# Altium footprint library cool_library.PcbLib: 1182 footprints (part 57 of 75)
Each footprint in its own frame and in the unit in brackets; x right, y up, seen from the top. Pads: shape width x height; smd on the part's side, far side on the other; paste and mask are expansions set on the pad; w line width, h text height; cw(c..) or ccw(c..) is an arc to the next point about the centre after c.
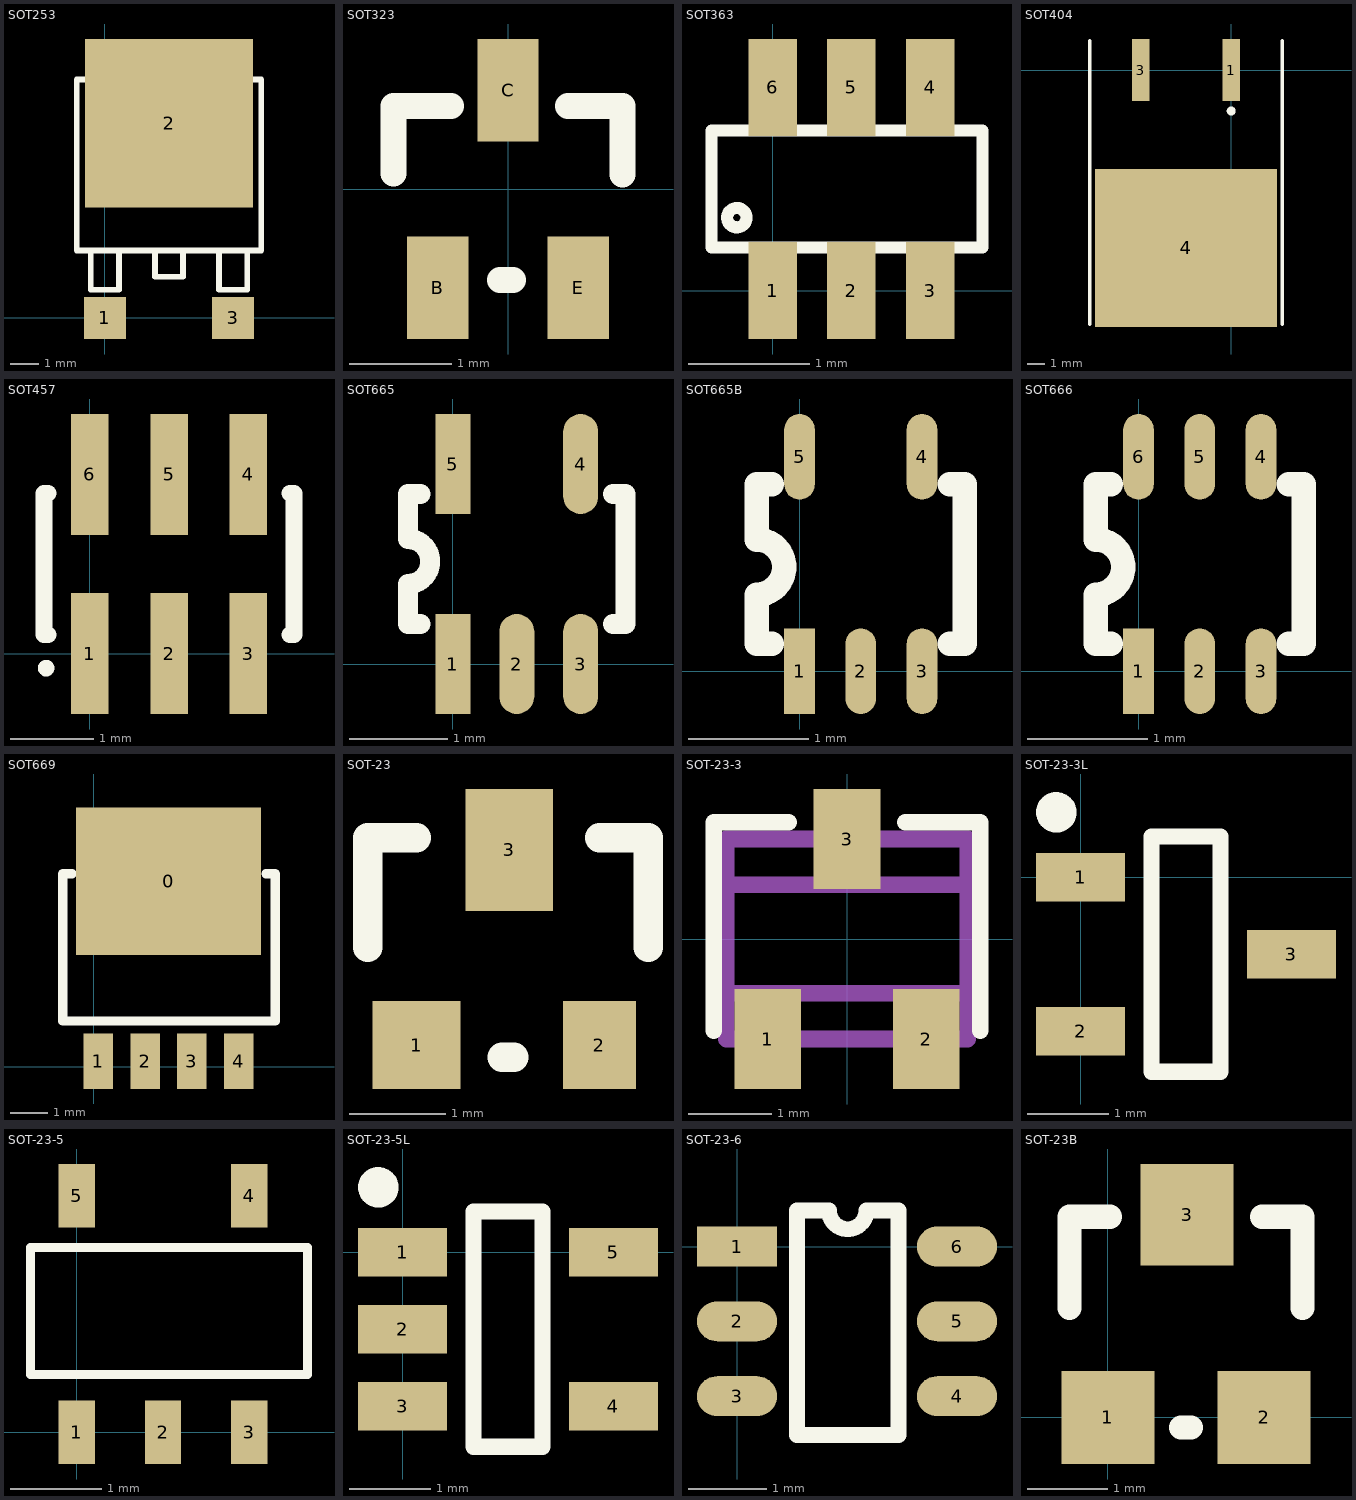
[diagram p56: the footprints below, top view; thin cyan lines are the x and y axes]

## SOT253 [mm]
pads (3):
  rect 1.5x1.5 smd: 1(0,0) 3(4.57,0)
  rect 6x6 smd: 2(2.285,6.94)
Top Overlay:
  lines w0.203: -0.755,8.5 -1.005,8.5 -1.005,2.4 5.575,2.4 5.575,8.5 5.325,8.5 ; -0.5,2.4 -0.5,1 0.5,1 0.5,2.4 ; 1.785,2.4 1.785,1.47 2.785,1.47 2.785,2.4 ; 4.07,2.4 4.07,1 5.07,1 5.07,2.4

## SOT323 [mm]
pads (3):
  rect 0.6x1 smd: B(-0.686,-0.965) C(0,0.965) E(0.686,-0.965)
Top Overlay:
  lines w0.254: -1.118,0.152 -1.118,0.813 -0.559,0.813 ; -0.076,-0.889 0.051,-0.889 ; 0.584,0.813 1.118,0.813 1.118,0.143
3D body: height 1.1, standoff 0, extent -1.092,-1.097 1.108,1.148

## SOT363 [mm]
pads (6):
  rect 0.4x0.8 smd: 1(0,0) 2(0.65,0) 3(1.3,0) 4(1.3,1.676) 5(0.65,1.676) 6(0,1.676)
Top Overlay:
  circle w0.1: c-0.295,0.602 r0.08
  lines w0.1: -0.503,0.356 1.732,0.356 1.732,1.321 -0.503,1.321 -0.503,0.356

## SOT404 [mm]
pads (3):
  rect 1x3.5 smd: 1(0,0) 3(-5.08,0)
  rect 10.25x8.9 smd: 4(-2.54,-9.998)
Top Overlay:
  circle w0.25: c0,-2.3 r0.125
  lines w0.2: -7.965,-14.3 -7.965,1.65 ; 2.885,-14.3 2.885,1.65

## SOT457 [mm]
pads (6):
  rect 0.45x1.45 smd: 1(0,0) 2(0.95,0) 3(1.9,0) 4(1.9,2.15) 5(0.95,2.15) 6(0,2.15)
Top Overlay:
  circle w0.1: c-0.525,-0.175 r0.05
  lines w0.2: -0.5,0.225 -0.55,0.225 -0.55,1.925 -0.5,1.925 ; 2.4,0.225 2.45,0.225 2.45,1.925 2.4,1.925

## SOT665 [mil]
pads (5):
  rect 14x40 smd: 1(0,0) 5(0,80)
  oval 14x40 smd: 2(25.59,0) 3(51.18,0) 4(51.18,80)
Top Overlay:
  lines w8: -13,16 -18,16 -18,32 ccw(c-18,41) -18,50 -18,68 -13,68 ; 64,16 69,16 69,68 64,68

## SOT665B [mil]
pads (5):
  rect 10x28 smd: 1(0,0)
  oval 10x28 smd: 2(20,0) 3(40,0) 4(40,70) 5(0,70)
Top Overlay:
  lines w8: -9,9 -14,9 -14,25 ccw(c-14,34) -14,43 -14,61 -9,61 ; 49,9 54,9 54,61 49,61

## SOT666 [mil]
pads (6):
  rect 10x28 smd: 1(0,0)
  oval 10x28 smd: 2(20,0) 3(40,0) 4(40,70) 5(20,70) 6(0,70)
Top Overlay:
  lines w8: -9,9 -14,9 -14,25 ccw(c-14,34) -14,43 -14,61 -9,61 ; 49,9 54,9 54,61 49,61

## SOT669 [mm] "IFPAK"
pads (5):
  rect 5x4 smd: 0(2.032,5.029)
  rect 0.8x1.5 smd: 1(0.127,0.152) 2(1.397,0.152) 3(2.667,0.152) 4(3.937,0.152)
Top Overlay:
  lines w0.254: -0.584,5.232 -0.838,5.232 -0.838,1.245 4.928,1.245 4.928,5.232 4.674,5.232
3D body: height 1.55, standoff 0.35, extent -0.418,-0.002 4.482,6.426

## SOT-23 [mil]
pads (3):
  rect 36x36 smd: 1(47.76,-120.28)
  rect 30x36 smd: 2(122.75,-120.28)
  rect 36x50 smd: 3(85.75,-40.28)
Top Overlay:
  lines w12: 27.75,-80.28 27.75,-35.28 47.76,-35.28 ; 82.75,-125.28 87.75,-125.28 ; 122.75,-35.28 142.75,-35.28 142.75,-80.28

## SOT-23-3 [mm]
pads (3):
  rect 0.8x1.2 smd: 1(-0.95,-1.2) 2(0.95,-1.2) 3(0,1.2)
Top Overlay:
  lines w0.2: -1.6,-1.1 -1.6,1.4 -0.7,1.4 ; 0.7,1.4 1.6,1.4 1.6,-1.1
Mechanical 1:
  lines w0.2: -1.45,-0.65 1.45,-0.65 ; -1.45,0.65 1.45,0.65 ; -1.15,-1.2 -1.15,-0.65 ; -0.75,-1.2 -0.75,-0.65 ; -0.2,0.65 -0.2,1.2 ; 0.2,0.65 0.2,1.2 ; 0.75,-1.2 0.75,-0.65 ; 1.15,-1.2 1.15,-0.65 ; -1.45,-1.2 -1.45,1.2 1.45,1.2 1.45,-1.2 -1.45,-1.2

## SOT-23-3L [mm]
pads (3):
  rect 1.1x0.6 smd: 1(0,0) 2(0,-1.9) 3(2.6,-0.95)
Top Overlay:
  circle w0.25: c-0.3,0.8 r0.125
  lines w0.2: 0.875,-2.4 1.725,-2.4 1.725,0.5 0.875,0.5 0.875,-2.4

## SOT-23-5 [mm]
pads (5):
  rect 0.4x0.7 smd: 1(0,0) 2(0.95,0) 3(1.9,0) 4(1.9,2.6) 5(0,2.6)
Top Overlay:
  lines w0.1: -0.508,0.635 -0.508,2.032 2.54,2.032 2.54,0.635 -0.508,0.635

## SOT-23-5L [mm]
height 8.23
pads (5):
  rect 1.1x0.6 smd: 1(0,0) 2(0,-0.95) 3(0,-1.9) 4(2.6,-1.9) 5(2.6,0)
Top Overlay:
  circle w0.25: c-0.3,0.8 r0.125
  lines w0.2: 0.875,-2.4 1.725,-2.4 1.725,0.5 0.875,0.5 0.875,-2.4

## SOT-23-6 [mil]
pads (6):
  rect 40x20 smd: 1(0,0)
  oval 40x20 smd: 2(0,-37.4) 3(0,-74.8) 4(110,-74.8) 5(110,-37.4) 6(110,0)
Top Overlay:
  lines w7.87: 30,18 30,-94.2 80.7,-94.2 80.7,18 ; 46,18 ccw(c55.35,18) 64.7,18
  lines w8: 30,18 46,18 ; 64.7,18 80.7,18

## SOT-23B [mil]
pads (3):
  rect 46x46 smd: 1(0,0) 2(77,0)
  rect 46x50 smd: 3(39,100)
Top Overlay:
  lines w12: -19,54 -19,99 1,99 ; 36,-5 41,-5 ; 76,99 96,99 96,54